# Altium integrated library GAPlib_SHIELD.IntLib: 3 symbols
Pins are listed as number, name and electrical type; pins without a type are passive.

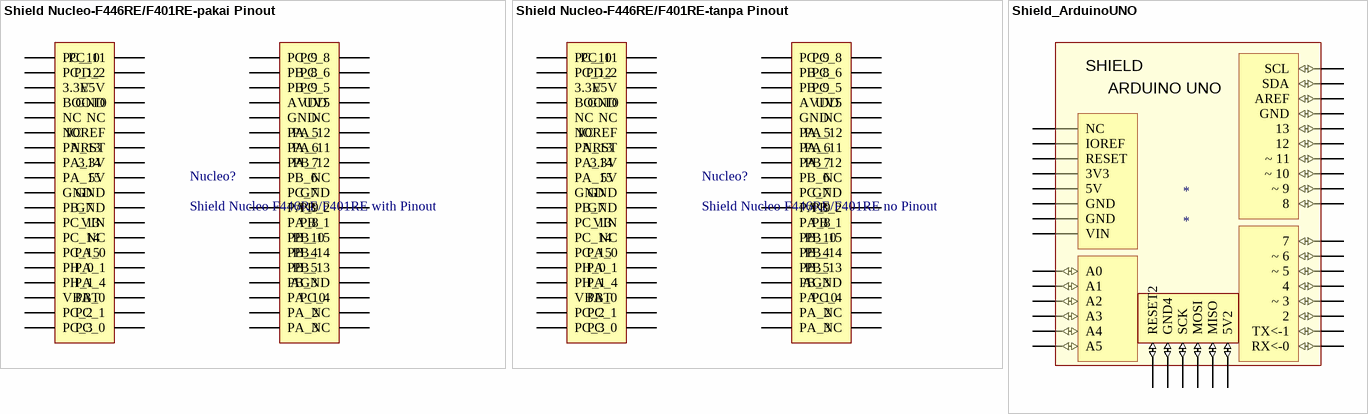
[diagram p0: symbols Shield Nucleo-F446RE/F401RE-pakai Pinout to Shield_ArduinoUNO]

## Shield Nucleo-F446RE/F401RE-pakai Pinout
designator Nucleo?, comment Shield Nucleo F446RE/F401RE with Pinout
Pakai Pinout
footprint Shield Nucleo-F446RE/F401RE-PAKAI Pinout (Pakai pin out)
pins: 3.3V, 3V3 3.3V, 5V, AGND, AVDD, BOOT0, E5V, GND, GND1 GND, GND2 GND, GND3 GND, GND4 GND, GND5 GND, IOREF, NC1 NC, NC2 NC, NC3 NC, NC4 NC, NC5 NC, NC6 NC, NC7 NC, NC8 NC, NRST, PA_0, PA_1, PA_2, PA_3, PA_4, PA_5, PA_6, PA_7, PA_8, PA_9, PA_10, PA_11, PA_12, PA_13, PA_14, PA_15, PB_0, PB_1, PB_2, PB_3, PB_4, PB_5, PB_6, PB_7, PB_8, PB_9, PB_10, PB_12, PB_13, PB_14, PB_15, PC_0, PC_1, PC_2, PC_3, PC_4, PC_5, PC_6, PC_7, PC_8, PC_9, PC_10, PC_11, PC_12, PC_13, PC_14, PC_15, PD_2, PH_0, PH_1, UV5, VBAT, VIN

## Shield Nucleo-F446RE/F401RE-tanpa Pinout
designator Nucleo?, comment Shield Nucleo F446RE/F401RE no Pinout
Tanpa Pinout
footprint Shield Nucleo-F446RE/F401RE-tanpaPinOut (Tanpa pin out)
pins: 3.3V, 3V3 3.3V, 5V, AGND, AVDD, BOOT0, E5V, GND, GND1 GND, GND2 GND, GND3 GND, GND4 GND, GND5 GND, IOREF, NC1 NC, NC2 NC, NC3 NC, NC4 NC, NC5 NC, NC6 NC, NC7 NC, NC8 NC, NRST, PA_0, PA_1, PA_2, PA_3, PA_4, PA_5, PA_6, PA_7, PA_8, PA_9, PA_10, PA_11, PA_12, PA_13, PA_14, PA_15, PB_0, PB_1, PB_2, PB_3, PB_4, PB_5, PB_6, PB_7, PB_8, PB_9, PB_10, PB_12, PB_13, PB_14, PB_15, PC_0, PC_1, PC_2, PC_3, PC_4, PC_5, PC_6, PC_7, PC_8, PC_9, PC_10, PC_11, PC_12, PC_13, PC_14, PC_15, PD_2, PH_0, PH_1, UV5, VBAT, VIN

## Shield_ArduinoUNO
designator *
footprint Shield_ArduinoUNO (Pakai pin out)
pins: 0 RX<-0 (io), 1 TX<-1 (io), 2 (io), 3 ~ 3 (io), 3V3 (power), 4 (io), 5 ~ 5 (io), 5V (power), 5V2 (io), 6 ~ 6 (io), 7 (io), 8 (io), 9 ~ 9 (io), 10 ~ 10 (io), 11 ~ 11 (io), 12 (io), 13 (io), A0 (io), A1 (io), A2 (io), A3 (io), A4 (io), A5 (io), AREF (io), GND1 GND (power), GND2 GND (power), GND3 GND (io), GND4 (io), IOREF (power), MISO (io), MOSI (io), NC, RESET, RESET2 (io), SCK (io), SCL (io), SDA (io), VIN (power)
text: SHIELD; ARDUINO UNO